# Altium footprint library Metric_SMD.PcbLib: 185 footprints (part 10 of 12)
Each footprint in its own frame and in the unit in brackets; x right, y up, seen from the top. Pads: shape width x height; smd on the part's side, far side on the other; paste and mask are expansions set on the pad; w line width, h text height; cw(c..) or ccw(c..) is an arc to the next point about the centre after c.
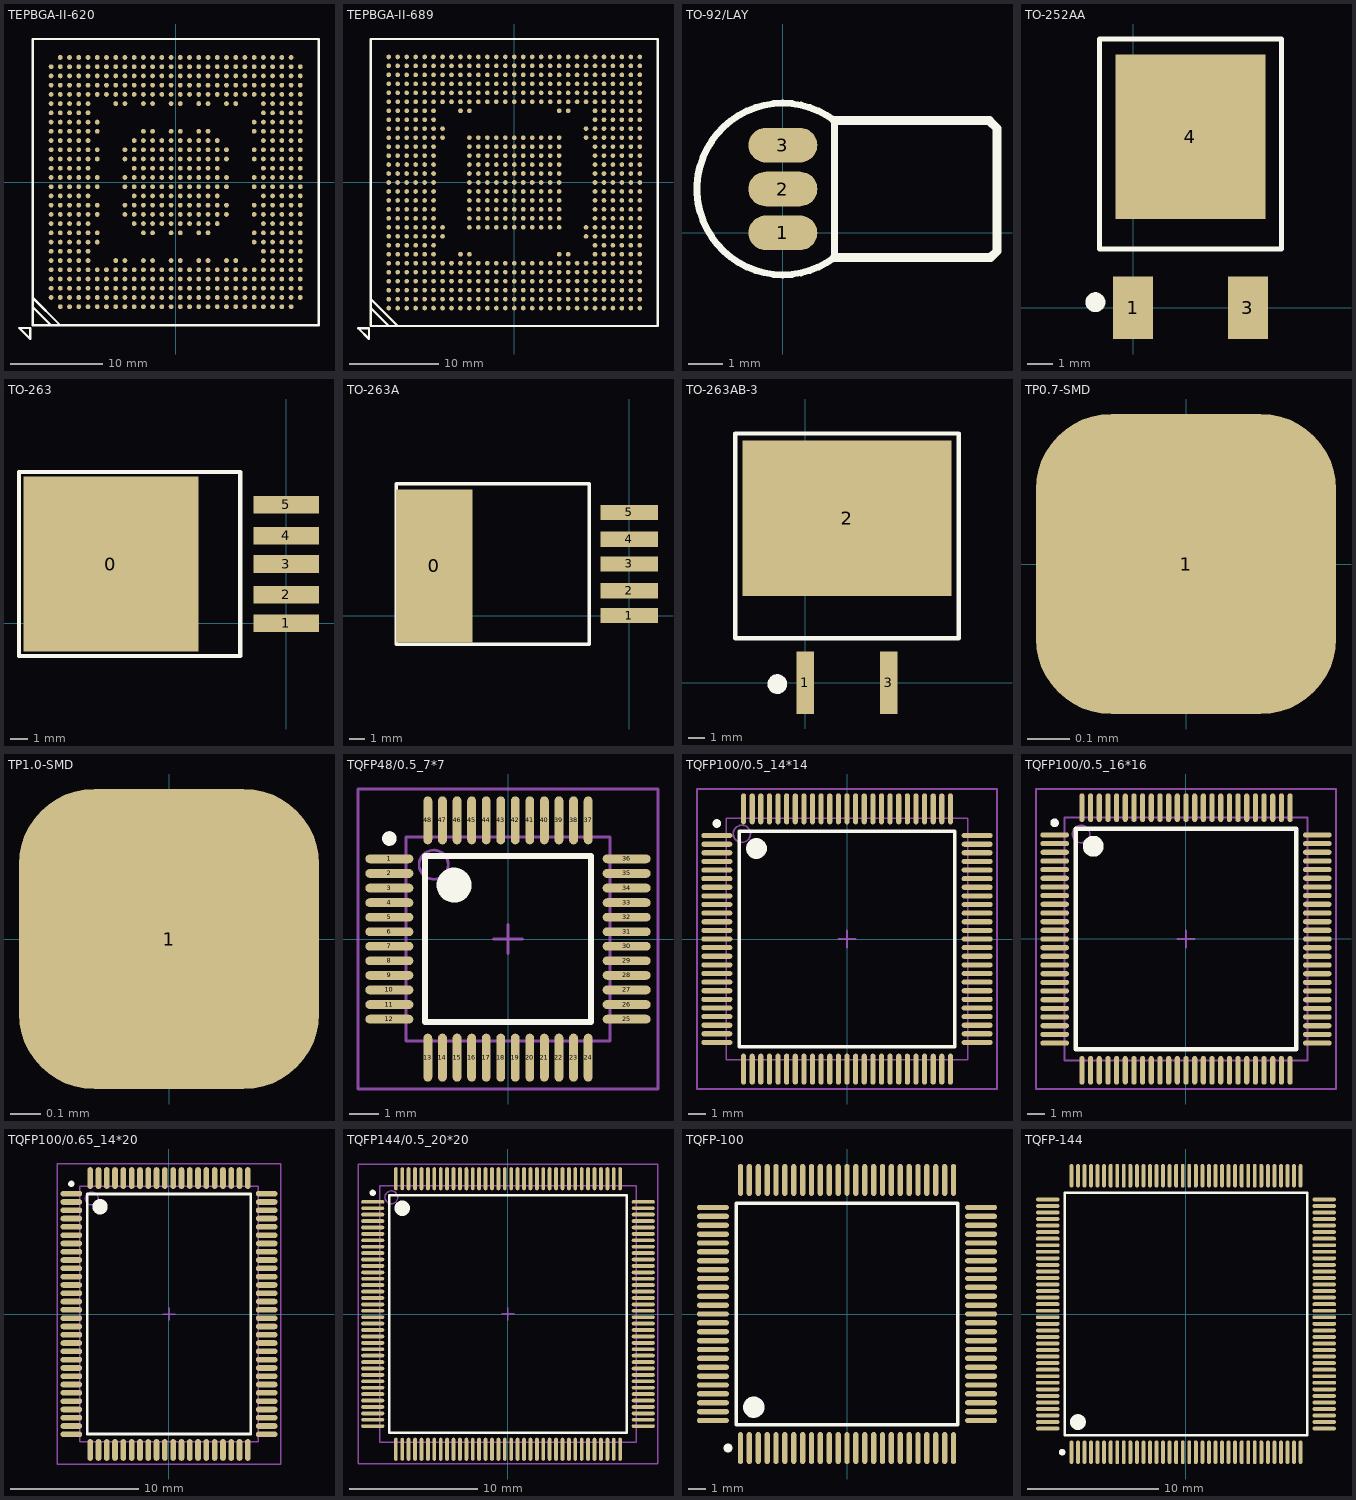
[diagram p9: the footprints below, top view; thin cyan lines are the x and y axes]

## TEPBGA-II-620 [mm] "1mm间距"
height 1
pads (620):
  round 0.52 smd: A2(-13.5,-12.5) A3(-13.5,-11.5) A4(-13.5,-10.5) A5(-13.5,-9.5) A6(-13.5,-8.5) A7(-13.5,-7.5) A8(-13.5,-6.5) A9(-13.5,-5.5) A10(-13.5,-4.5) A11(-13.5,-3.5) A12(-13.5,-2.5) A13(-13.5,-1.5) A14(-13.5,-0.5) A15(-13.5,0.5) A16(-13.5,1.5) A17(-13.5,2.5) A18(-13.5,3.5) A19(-13.5,4.5) A20(-13.5,5.5) A21(-13.5,6.5) A22(-13.5,7.5) A23(-13.5,8.5) A24(-13.5,9.5) A25(-13.5,10.5) A26(-13.5,11.5) A27(-13.5,12.5) AA1(6.5,-13.5) AA2(6.5,-12.5) AA3(6.5,-11.5) AA4(6.5,-10.5) AA5(6.5,-9.5) AA6(6.5,-8.5) AA23(6.5,8.5) AA24(6.5,9.5) AA25(6.5,10.5) AA26(6.5,11.5) AA27(6.5,12.5) AA28(6.5,13.5) AB1(7.5,-13.5) AB2(7.5,-12.5) AB3(7.5,-11.5) AB4(7.5,-10.5) AB5(7.5,-9.5) AB24(7.5,9.5) AB25(7.5,10.5) AB26(7.5,11.5) AB27(7.5,12.5) AB28(7.5,13.5) AC1(8.5,-13.5) AC2(8.5,-12.5) AC3(8.5,-11.5) AC4(8.5,-10.5) AC5(8.5,-9.5) AC8(8.5,-6.5) AC9(8.5,-5.5) AC11(8.5,-3.5) AC12(8.5,-2.5) AC14(8.5,-0.5) AC15(8.5,0.5) AC17(8.5,2.5) AC18(8.5,3.5) AC20(8.5,5.5) AC21(8.5,6.5) AC24(8.5,9.5) AC25(8.5,10.5) AC26(8.5,11.5) AC27(8.5,12.5) AC28(8.5,13.5) AD1(9.5,-13.5) AD2(9.5,-12.5) AD3(9.5,-11.5) AD4(9.5,-10.5) AD5(9.5,-9.5) AD6(9.5,-8.5) AD7(9.5,-7.5) AD8(9.5,-6.5) AD9(9.5,-5.5) AD10(9.5,-4.5) AD11(9.5,-3.5) AD12(9.5,-2.5) AD13(9.5,-1.5) AD14(9.5,-0.5) AD15(9.5,0.5) AD16(9.5,1.5) AD17(9.5,2.5) AD18(9.5,3.5) AD19(9.5,4.5) AD20(9.5,5.5) AD21(9.5,6.5) AD22(9.5,7.5) AD23(9.5,8.5) AD24(9.5,9.5) AD25(9.5,10.5) AD26(9.5,11.5) AD27(9.5,12.5) AD28(9.5,13.5) AE1(10.5,-13.5) AE2(10.5,-12.5) AE3(10.5,-11.5) AE4(10.5,-10.5) AE5(10.5,-9.5) AE6(10.5,-8.5) AE7(10.5,-7.5) AE8(10.5,-6.5) AE9(10.5,-5.5) AE10(10.5,-4.5) AE11(10.5,-3.5) AE12(10.5,-2.5) AE13(10.5,-1.5) AE14(10.5,-0.5) AE15(10.5,0.5) AE16(10.5,1.5) AE17(10.5,2.5) AE18(10.5,3.5) AE19(10.5,4.5) AE20(10.5,5.5) AE21(10.5,6.5) AE22(10.5,7.5) AE23(10.5,8.5) AE24(10.5,9.5) AE25(10.5,10.5) AE26(10.5,11.5) AE27(10.5,12.5) AE28(10.5,13.5) AF1(11.5,-13.5) AF2(11.5,-12.5) AF3(11.5,-11.5) AF4(11.5,-10.5) AF5(11.5,-9.5) AF6(11.5,-8.5) AF7(11.5,-7.5) AF8(11.5,-6.5) AF9(11.5,-5.5) AF10(11.5,-4.5) AF11(11.5,-3.5) AF12(11.5,-2.5) AF13(11.5,-1.5) AF14(11.5,-0.5) AF15(11.5,0.5) AF16(11.5,1.5) AF17(11.5,2.5) AF18(11.5,3.5) AF19(11.5,4.5) AF20(11.5,5.5) AF21(11.5,6.5) AF22(11.5,7.5) AF23(11.5,8.5) AF24(11.5,9.5) AF25(11.5,10.5) AF26(11.5,11.5) AF27(11.5,12.5) AF28(11.5,13.5) AG1(12.5,-13.5) AG2(12.5,-12.5) AG3(12.5,-11.5) AG4(12.5,-10.5) AG5(12.5,-9.5) AG6(12.5,-8.5) AG7(12.5,-7.5) AG8(12.5,-6.5) AG9(12.5,-5.5) AG10(12.5,-4.5) AG11(12.5,-3.5) AG12(12.5,-2.5) AG13(12.5,-1.5) AG14(12.5,-0.5) AG15(12.5,0.5) AG16(12.5,1.5) AG17(12.5,2.5) AG18(12.5,3.5) AG19(12.5,4.5) AG20(12.5,5.5) AG21(12.5,6.5) AG22(12.5,7.5) AG23(12.5,8.5) AG24(12.5,9.5) AG25(12.5,10.5) AG26(12.5,11.5) AG27(12.5,12.5) AG28(12.5,13.5) AH2(13.5,-12.5) AH3(13.5,-11.5) AH4(13.5,-10.5) AH5(13.5,-9.5) AH6(13.5,-8.5) AH7(13.5,-7.5) AH8(13.5,-6.5) AH9(13.5,-5.5) AH10(13.5,-4.5) AH11(13.5,-3.5) AH12(13.5,-2.5) AH13(13.5,-1.5) AH14(13.5,-0.5) AH15(13.5,0.5) AH16(13.5,1.5) AH17(13.5,2.5) AH18(13.5,3.5) AH19(13.5,4.5) AH20(13.5,5.5) AH21(13.5,6.5) AH22(13.5,7.5) AH23(13.5,8.5) AH24(13.5,9.5) AH25(13.5,10.5) AH26(13.5,11.5) AH27(13.5,12.5) B1(-12.5,-13.5) B2(-12.5,-12.5) B3(-12.5,-11.5) B4(-12.5,-10.5) B5(-12.5,-9.5) B6(-12.5,-8.5) B7(-12.5,-7.5) B8(-12.5,-6.5) B9(-12.5,-5.5) B10(-12.5,-4.5) B11(-12.5,-3.5) B12(-12.5,-2.5) B13(-12.5,-1.5) B14(-12.5,-0.5) B15(-12.5,0.5) B16(-12.5,1.5) B17(-12.5,2.5) B18(-12.5,3.5) B19(-12.5,4.5) B20(-12.5,5.5) B21(-12.5,6.5) B22(-12.5,7.5) B23(-12.5,8.5) B24(-12.5,9.5) B25(-12.5,10.5) B26(-12.5,11.5) B27(-12.5,12.5) B28(-12.5,13.5) C1(-11.5,-13.5) C2(-11.5,-12.5) C3(-11.5,-11.5) C4(-11.5,-10.5) C5(-11.5,-9.5) C6(-11.5,-8.5) C7(-11.5,-7.5) C8(-11.5,-6.5) C9(-11.5,-5.5) C10(-11.5,-4.5) C11(-11.5,-3.5) C12(-11.5,-2.5) C13(-11.5,-1.5) C14(-11.5,-0.5) C15(-11.5,0.5) C16(-11.5,1.5) C17(-11.5,2.5) C18(-11.5,3.5) C19(-11.5,4.5) C20(-11.5,5.5) C21(-11.5,6.5) C22(-11.5,7.5) C23(-11.5,8.5) C24(-11.5,9.5) C25(-11.5,10.5) C26(-11.5,11.5) C27(-11.5,12.5) C28(-11.5,13.5) D1(-10.5,-13.5) D2(-10.5,-12.5) D3(-10.5,-11.5) D4(-10.5,-10.5) D5(-10.5,-9.5) D6(-10.5,-8.5) D7(-10.5,-7.5) D8(-10.5,-6.5) D9(-10.5,-5.5) D10(-10.5,-4.5) D11(-10.5,-3.5) D12(-10.5,-2.5) D13(-10.5,-1.5) D14(-10.5,-0.5) D15(-10.5,0.5) D16(-10.5,1.5) D17(-10.5,2.5) D18(-10.5,3.5) D19(-10.5,4.5) D20(-10.5,5.5) D21(-10.5,6.5) D22(-10.5,7.5) D23(-10.5,8.5) D24(-10.5,9.5) D25(-10.5,10.5) D26(-10.5,11.5) D27(-10.5,12.5) D28(-10.5,13.5) E1(-9.5,-13.5) E2(-9.5,-12.5) E3(-9.5,-11.5) E4(-9.5,-10.5) E5(-9.5,-9.5) E6(-9.5,-8.5) E7(-9.5,-7.5) E8(-9.5,-6.5) E9(-9.5,-5.5) E10(-9.5,-4.5) E11(-9.5,-3.5) E12(-9.5,-2.5) E13(-9.5,-1.5) E14(-9.5,-0.5) E15(-9.5,0.5) E16(-9.5,1.5) E17(-9.5,2.5) E18(-9.5,3.5) E19(-9.5,4.5) E20(-9.5,5.5) E21(-9.5,6.5) E22(-9.5,7.5) E23(-9.5,8.5) E24(-9.5,9.5) E25(-9.5,10.5) E26(-9.5,11.5) E27(-9.5,12.5) E28(-9.5,13.5) F1(-8.5,-13.5) F2(-8.5,-12.5) F3(-8.5,-11.5) F4(-8.5,-10.5) F5(-8.5,-9.5) F8(-8.5,-6.5) F9(-8.5,-5.5) F11(-8.5,-3.5) F12(-8.5,-2.5) F14(-8.5,-0.5) F15(-8.5,0.5) F17(-8.5,2.5) F18(-8.5,3.5) F20(-8.5,5.5) F21(-8.5,6.5) F24(-8.5,9.5) F25(-8.5,10.5) F26(-8.5,11.5) F27(-8.5,12.5) F28(-8.5,13.5) G1(-7.5,-13.5) G2(-7.5,-12.5) G3(-7.5,-11.5) G4(-7.5,-10.5) G5(-7.5,-9.5) G24(-7.5,9.5) G25(-7.5,10.5) G26(-7.5,11.5) G27(-7.5,12.5) G28(-7.5,13.5) H1(-6.5,-13.5) H2(-6.5,-12.5) H3(-6.5,-11.5) H4(-6.5,-10.5) H5(-6.5,-9.5) H6(-6.5,-8.5) H23(-6.5,8.5) H24(-6.5,9.5) H25(-6.5,10.5) H26(-6.5,11.5) H27(-6.5,12.5) H28(-6.5,13.5) J1(-5.5,-13.5) J2(-5.5,-12.5) J3(-5.5,-11.5) J4(-5.5,-10.5) J5(-5.5,-9.5) J6(-5.5,-8.5) J11(-5.5,-3.5) J12(-5.5,-2.5) J14(-5.5,-0.5) J15(-5.5,0.5) J17(-5.5,2.5) J18(-5.5,3.5) J23(-5.5,8.5) J24(-5.5,9.5) J25(-5.5,10.5) J26(-5.5,11.5) J27(-5.5,12.5) J28(-5.5,13.5) K1(-4.5,-13.5) K2(-4.5,-12.5) K3(-4.5,-11.5) K4(-4.5,-10.5) K5(-4.5,-9.5) K10(-4.5,-4.5) K11(-4.5,-3.5) K12(-4.5,-2.5) K13(-4.5,-1.5) K14(-4.5,-0.5) K15(-4.5,0.5) K16(-4.5,1.5) K17(-4.5,2.5) K18(-4.5,3.5) K19(-4.5,4.5) K24(-4.5,9.5) K25(-4.5,10.5) K26(-4.5,11.5) K27(-4.5,12.5) K28(-4.5,13.5) L1(-3.5,-13.5) L2(-3.5,-12.5) L3(-3.5,-11.5) L4(-3.5,-10.5) L5(-3.5,-9.5) L6(-3.5,-8.5) L9(-3.5,-5.5) L10(-3.5,-4.5) L11(-3.5,-3.5) L12(-3.5,-2.5) L13(-3.5,-1.5) L14(-3.5,-0.5) L15(-3.5,0.5) L16(-3.5,1.5) L17(-3.5,2.5) L18(-3.5,3.5) L19(-3.5,4.5) L20(-3.5,5.5) L23(-3.5,8.5) L24(-3.5,9.5) L25(-3.5,10.5) L26(-3.5,11.5) L27(-3.5,12.5) L28(-3.5,13.5) M1(-2.5,-13.5) M2(-2.5,-12.5) M3(-2.5,-11.5) M4(-2.5,-10.5) M5(-2.5,-9.5) M6(-2.5,-8.5) M9(-2.5,-5.5) M10(-2.5,-4.5) M11(-2.5,-3.5) M12(-2.5,-2.5) M13(-2.5,-1.5) M14(-2.5,-0.5) M15(-2.5,0.5) M16(-2.5,1.5) M17(-2.5,2.5) M18(-2.5,3.5) M19(-2.5,4.5) M20(-2.5,5.5) M23(-2.5,8.5) M24(-2.5,9.5) M25(-2.5,10.5) M26(-2.5,11.5) M27(-2.5,12.5) M28(-2.5,13.5) N1(-1.5,-13.5) N2(-1.5,-12.5) N3(-1.5,-11.5) N4(-1.5,-10.5) N5(-1.5,-9.5) N10(-1.5,-4.5) N11(-1.5,-3.5) N12(-1.5,-2.5) N13(-1.5,-1.5) N14(-1.5,-0.5) N15(-1.5,0.5) N16(-1.5,1.5) N17(-1.5,2.5) N18(-1.5,3.5) N19(-1.5,4.5) N24(-1.5,9.5) N25(-1.5,10.5) N26(-1.5,11.5) N27(-1.5,12.5) N28(-1.5,13.5) P1(-0.5,-13.5) P2(-0.5,-12.5) P3(-0.5,-11.5) P4(-0.5,-10.5) P5(-0.5,-9.5) P6(-0.5,-8.5) P9(-0.5,-5.5) P10(-0.5,-4.5) P11(-0.5,-3.5) P12(-0.5,-2.5) P13(-0.5,-1.5) P14(-0.5,-0.5) P15(-0.5,0.5) P16(-0.5,1.5) P17(-0.5,2.5) P18(-0.5,3.5) P19(-0.5,4.5) P20(-0.5,5.5) P23(-0.5,8.5) P24(-0.5,9.5) P25(-0.5,10.5) P26(-0.5,11.5) P27(-0.5,12.5) P28(-0.5,13.5) R1(0.5,-13.5) R2(0.5,-12.5) R3(0.5,-11.5) R4(0.5,-10.5) R5(0.5,-9.5) R6(0.5,-8.5) R9(0.5,-5.5) R10(0.5,-4.5) R11(0.5,-3.5) R12(0.5,-2.5) R13(0.5,-1.5) R14(0.5,-0.5) R15(0.5,0.5) R16(0.5,1.5) R17(0.5,2.5) R18(0.5,3.5) R19(0.5,4.5) R20(0.5,5.5) R23(0.5,8.5) R24(0.5,9.5) R25(0.5,10.5) R26(0.5,11.5) R27(0.5,12.5) R28(0.5,13.5) T1(1.5,-13.5) T2(1.5,-12.5) T3(1.5,-11.5) T4(1.5,-10.5) T5(1.5,-9.5) T10(1.5,-4.5) T11(1.5,-3.5) T12(1.5,-2.5) T13(1.5,-1.5) T14(1.5,-0.5) T15(1.5,0.5) T16(1.5,1.5) T17(1.5,2.5) T18(1.5,3.5) T19(1.5,4.5) T24(1.5,9.5) T25(1.5,10.5) T26(1.5,11.5) T27(1.5,12.5) T28(1.5,13.5) U1(2.5,-13.5) U2(2.5,-12.5) U3(2.5,-11.5) U4(2.5,-10.5) U5(2.5,-9.5) U6(2.5,-8.5) U9(2.5,-5.5) U10(2.5,-4.5) U11(2.5,-3.5) U12(2.5,-2.5) U13(2.5,-1.5) U14(2.5,-0.5) U15(2.5,0.5) U16(2.5,1.5) U17(2.5,2.5) U18(2.5,3.5) U19(2.5,4.5) U20(2.5,5.5) U23(2.5,8.5) U24(2.5,9.5) U25(2.5,10.5) U26(2.5,11.5) U27(2.5,12.5) U28(2.5,13.5) V1(3.5,-13.5) V2(3.5,-12.5) V3(3.5,-11.5) V4(3.5,-10.5) V5(3.5,-9.5) V6(3.5,-8.5) V9(3.5,-5.5) V10(3.5,-4.5) V11(3.5,-3.5) V12(3.5,-2.5) V13(3.5,-1.5) V14(3.5,-0.5) V15(3.5,0.5) V16(3.5,1.5) V17(3.5,2.5) V18(3.5,3.5) V19(3.5,4.5) V20(3.5,5.5) V23(3.5,8.5) V24(3.5,9.5) V25(3.5,10.5) V26(3.5,11.5) V27(3.5,12.5) V28(3.5,13.5) W1(4.5,-13.5) W2(4.5,-12.5) W3(4.5,-11.5) W4(4.5,-10.5) W5(4.5,-9.5) W10(4.5,-4.5) W11(4.5,-3.5) W12(4.5,-2.5) W13(4.5,-1.5) W14(4.5,-0.5) W15(4.5,0.5) W16(4.5,1.5) W17(4.5,2.5) W18(4.5,3.5) W19(4.5,4.5) W24(4.5,9.5) W25(4.5,10.5) W26(4.5,11.5) W27(4.5,12.5) W28(4.5,13.5) Y1(5.5,-13.5) Y2(5.5,-12.5) Y3(5.5,-11.5) Y4(5.5,-10.5) Y5(5.5,-9.5) Y6(5.5,-8.5) Y11(5.5,-3.5) Y12(5.5,-2.5) Y14(5.5,-0.5) Y15(5.5,0.5) Y17(5.5,2.5) Y18(5.5,3.5) Y23(5.5,8.5) Y24(5.5,9.5) Y25(5.5,10.5) Y26(5.5,11.5) Y27(5.5,12.5) Y28(5.5,13.5)
Top Overlay:
  lines w0.254: -15.5,-13.5 -13.5,-15.5 ; -15.5,-12.5 -12.5,-15.5 ; -16.95,-15.8 -15.75,-17 -15.75,-15.8 -16.95,-15.8 ; -15.5,-15.5 15.5,-15.5 15.5,15.5 -15.5,15.5 -15.5,-15.5
3D body: height 1.3, standoff 0.7, extent -12.5,-12.5 12.5,12.5
3D body: height 1, standoff 0.1, extent -15.5,-15.5 15.5,15.5

## TEPBGA-II-689 [mm] "1mm间距"
height 1
pads (689):
  round 0.52 smd: A1(-14,-14) A2(-14,-13) A3(-14,-12) A4(-14,-11) A5(-14,-10) A6(-14,-9) A7(-14,-8) A8(-14,-7) A9(-14,-6) A10(-14,-5) A11(-14,-4) A12(-14,-3) A13(-14,-2) A14(-14,-1) A15(-14,0) A16(-14,1) A17(-14,2) A18(-14,3) A19(-14,4) A20(-14,5) A21(-14,6) A22(-14,7) A23(-14,8) A24(-14,9) A25(-14,10) A26(-14,11) A27(-14,12) A28(-14,13) A29(-14,14) AA1(6,-14) AA2(6,-13) AA3(6,-12) AA4(6,-11) AA5(6,-10) AA6(6,-9) AA7(6,-8) AA23(6,8) AA24(6,9) AA25(6,10) AA26(6,11) AA27(6,12) AA28(6,13) AA29(6,14) AB1(7,-14) AB2(7,-13) AB3(7,-12) AB4(7,-11) AB5(7,-10) AB6(7,-9) AB24(7,9) AB25(7,10) AB26(7,11) AB27(7,12) AB28(7,13) AB29(7,14) AC1(8,-14) AC2(8,-13) AC3(8,-12) AC4(8,-11) AC5(8,-10) AC6(8,-9) AC9(8,-6) AC10(8,-5) AC20(8,5) AC21(8,6) AC24(8,9) AC25(8,10) AC26(8,11) AC27(8,12) AC28(8,13) AC29(8,14) AD1(9,-14) AD2(9,-13) AD3(9,-12) AD4(9,-11) AD5(9,-10) AD6(9,-9) AD7(9,-8) AD8(9,-7) AD9(9,-6) AD10(9,-5) AD11(9,-4) AD12(9,-3) AD13(9,-2) AD14(9,-1) AD15(9,0) AD16(9,1) AD17(9,2) AD18(9,3) AD19(9,4) AD20(9,5) AD21(9,6) AD22(9,7) AD23(9,8) AD24(9,9) AD25(9,10) AD26(9,11) AD27(9,12) AD28(9,13) AD29(9,14) AE1(10,-14) AE2(10,-13) AE3(10,-12) AE4(10,-11) AE5(10,-10) AE6(10,-9) AE7(10,-8) AE8(10,-7) AE9(10,-6) AE10(10,-5) AE11(10,-4) AE12(10,-3) AE13(10,-2) AE14(10,-1) AE15(10,0) AE16(10,1) AE17(10,2) AE18(10,3) AE19(10,4) AE20(10,5) AE21(10,6) AE22(10,7) AE23(10,8) AE24(10,9) AE25(10,10) AE26(10,11) AE27(10,12) AE28(10,13) AE29(10,14) AF1(11,-14) AF2(11,-13) AF3(11,-12) AF4(11,-11) AF5(11,-10) AF6(11,-9) AF7(11,-8) AF8(11,-7) AF9(11,-6) AF10(11,-5) AF11(11,-4) AF12(11,-3) AF13(11,-2) AF14(11,-1) AF15(11,0) AF16(11,1) AF17(11,2) AF18(11,3) AF19(11,4) AF20(11,5) AF21(11,6) AF22(11,7) AF23(11,8) AF24(11,9) AF25(11,10) AF26(11,11) AF27(11,12) AF28(11,13) AF29(11,14) AG1(12,-14) AG2(12,-13) AG3(12,-12) AG4(12,-11) AG5(12,-10) AG6(12,-9) AG7(12,-8) AG8(12,-7) AG9(12,-6) AG10(12,-5) AG11(12,-4) AG12(12,-3) AG13(12,-2) AG14(12,-1) AG15(12,0) AG16(12,1) AG17(12,2) AG18(12,3) AG19(12,4) AG20(12,5) AG21(12,6) AG22(12,7) AG23(12,8) AG24(12,9) AG25(12,10) AG26(12,11) AG27(12,12) AG28(12,13) AG29(12,14) AH1(13,-14) AH2(13,-13) AH3(13,-12) AH4(13,-11) AH5(13,-10) AH6(13,-9) AH7(13,-8) AH8(13,-7) AH9(13,-6) AH10(13,-5) AH11(13,-4) AH12(13,-3) AH13(13,-2) AH14(13,-1) AH15(13,0) AH16(13,1) AH17(13,2) AH18(13,3) AH19(13,4) AH20(13,5) AH21(13,6) AH22(13,7) AH23(13,8) AH24(13,9) AH25(13,10) AH26(13,11) AH27(13,12) AH28(13,13) AH29(13,14) AJ1(14,-14) AJ2(14,-13) AJ3(14,-12) AJ4(14,-11) AJ5(14,-10) AJ6(14,-9) AJ7(14,-8) AJ8(14,-7) AJ9(14,-6) AJ10(14,-5) AJ11(14,-4) AJ12(14,-3) AJ13(14,-2) AJ14(14,-1) AJ15(14,0) AJ16(14,1) AJ17(14,2) AJ18(14,3) AJ19(14,4) AJ20(14,5) AJ21(14,6) AJ22(14,7) AJ23(14,8) AJ24(14,9) AJ25(14,10) AJ26(14,11) AJ27(14,12) AJ28(14,13) AJ29(14,14) B1(-13,-14) B2(-13,-13) B3(-13,-12) B4(-13,-11) B5(-13,-10) B6(-13,-9) B7(-13,-8) B8(-13,-7) B9(-13,-6) B10(-13,-5) B11(-13,-4) B12(-13,-3) B13(-13,-2) B14(-13,-1) B15(-13,0) B16(-13,1) B17(-13,2) B18(-13,3) B19(-13,4) B20(-13,5) B21(-13,6) B22(-13,7) B23(-13,8) B24(-13,9) B25(-13,10) B26(-13,11) B27(-13,12) B28(-13,13) B29(-13,14) C1(-12,-14) C2(-12,-13) C3(-12,-12) C4(-12,-11) C5(-12,-10) C6(-12,-9) C7(-12,-8) C8(-12,-7) C9(-12,-6) C10(-12,-5) C11(-12,-4) C12(-12,-3) C13(-12,-2) C14(-12,-1) C15(-12,0) C16(-12,1) C17(-12,2) C18(-12,3) C19(-12,4) C20(-12,5) C21(-12,6) C22(-12,7) C23(-12,8) C24(-12,9) C25(-12,10) C26(-12,11) C27(-12,12) C28(-12,13) C29(-12,14) D1(-11,-14) D2(-11,-13) D3(-11,-12) D4(-11,-11) D5(-11,-10) D6(-11,-9) D7(-11,-8) D8(-11,-7) D9(-11,-6) D10(-11,-5) D11(-11,-4) D12(-11,-3) D13(-11,-2) D14(-11,-1) D15(-11,0) D16(-11,1) D17(-11,2) D18(-11,3) D19(-11,4) D20(-11,5) D21(-11,6) D22(-11,7) D23(-11,8) D24(-11,9) D25(-11,10) D26(-11,11) D27(-11,12) D28(-11,13) D29(-11,14) E1(-10,-14) E2(-10,-13) E3(-10,-12) E4(-10,-11) E5(-10,-10) E6(-10,-9) E7(-10,-8) E8(-10,-7) E9(-10,-6) E10(-10,-5) E11(-10,-4) E12(-10,-3) E13(-10,-2) E14(-10,-1) E15(-10,0) E16(-10,1) E17(-10,2) E18(-10,3) E19(-10,4) E20(-10,5) E21(-10,6) E22(-10,7) E23(-10,8) E24(-10,9) E25(-10,10) E26(-10,11) E27(-10,12) E28(-10,13) E29(-10,14) F1(-9,-14) F2(-9,-13) F3(-9,-12) F4(-9,-11) F5(-9,-10) F6(-9,-9) F7(-9,-8) F8(-9,-7) F9(-9,-6) F10(-9,-5) F11(-9,-4) F12(-9,-3) F13(-9,-2) F14(-9,-1) F15(-9,0) F16(-9,1) F17(-9,2) F18(-9,3) F19(-9,4) F20(-9,5) F21(-9,6) F22(-9,7) F23(-9,8) F24(-9,9) F25(-9,10) F26(-9,11) F27(-9,12) F28(-9,13) F29(-9,14) G1(-8,-14) G2(-8,-13) G3(-8,-12) G4(-8,-11) G5(-8,-10) G6(-8,-9) G9(-8,-6) G10(-8,-5) G20(-8,5) G21(-8,6) G24(-8,9) G25(-8,10) G26(-8,11) G27(-8,12) G28(-8,13) G29(-8,14) H1(-7,-14) H2(-7,-13) H3(-7,-12) H4(-7,-11) H5(-7,-10) H6(-7,-9) H24(-7,9) H25(-7,10) H26(-7,11) H27(-7,12) H28(-7,13) H29(-7,14) J1(-6,-14) J2(-6,-13) J3(-6,-12) J4(-6,-11) J5(-6,-10) J6(-6,-9) J7(-6,-8) J23(-6,8) J24(-6,9) J25(-6,10) J26(-6,11) J27(-6,12) J28(-6,13) J29(-6,14) K1(-5,-14) K2(-5,-13) K3(-5,-12) K4(-5,-11) K5(-5,-10) K6(-5,-9) K7(-5,-8) K10(-5,-5) K11(-5,-4) K12(-5,-3) K13(-5,-2) K14(-5,-1) K15(-5,0) K16(-5,1) K17(-5,2) K18(-5,3) K19(-5,4) K20(-5,5) K23(-5,8) K24(-5,9) K25(-5,10) K26(-5,11) K27(-5,12) K28(-5,13) K29(-5,14) L1(-4,-14) L2(-4,-13) L3(-4,-12) L4(-4,-11) L5(-4,-10) L6(-4,-9) L10(-4,-5) L11(-4,-4) L12(-4,-3) L13(-4,-2) L14(-4,-1) L15(-4,0) L16(-4,1) L17(-4,2) L18(-4,3) L19(-4,4) L20(-4,5) L24(-4,9) L25(-4,10) L26(-4,11) L27(-4,12) L28(-4,13) L29(-4,14) M1(-3,-14) M2(-3,-13) M3(-3,-12) M4(-3,-11) M5(-3,-10) M6(-3,-9) M10(-3,-5) M11(-3,-4) M12(-3,-3) M13(-3,-2) M14(-3,-1) M15(-3,0) M16(-3,1) M17(-3,2) M18(-3,3) M19(-3,4) M20(-3,5) M24(-3,9) M25(-3,10) M26(-3,11) M27(-3,12) M28(-3,13) M29(-3,14) N1(-2,-14) N2(-2,-13) N3(-2,-12) N4(-2,-11) N5(-2,-10) N6(-2,-9) N10(-2,-5) N11(-2,-4) N12(-2,-3) N13(-2,-2) N14(-2,-1) N15(-2,0) N16(-2,1) N17(-2,2) N18(-2,3) N19(-2,4) N20(-2,5) N24(-2,9) N25(-2,10) N26(-2,11) N27(-2,12) N28(-2,13) N29(-2,14) P1(-1,-14) P2(-1,-13) P3(-1,-12) P4(-1,-11) P5(-1,-10) P6(-1,-9) P10(-1,-5) P11(-1,-4) P12(-1,-3) P13(-1,-2) P14(-1,-1) P15(-1,0) P16(-1,1) P17(-1,2) P18(-1,3) P19(-1,4) P20(-1,5) P24(-1,9) P25(-1,10) P26(-1,11) P27(-1,12) P28(-1,13) P29(-1,14) R1(0,-14) R2(0,-13) R3(0,-12) R4(0,-11) R5(0,-10) R6(0,-9) R10(0,-5) R11(0,-4) R12(0,-3) R13(0,-2) R14(0,-1) R15(0,0) R16(0,1) R17(0,2) R18(0,3) R19(0,4) R20(0,5) R24(0,9) R25(0,10) R26(0,11) R27(0,12) R28(0,13) R29(0,14) T1(1,-14) T2(1,-13) T3(1,-12) T4(1,-11) T5(1,-10) T6(1,-9) T10(1,-5) T11(1,-4) T12(1,-3) T13(1,-2) T14(1,-1) T15(1,0) T16(1,1) T17(1,2) T18(1,3) T19(1,4) T20(1,5) T24(1,9) T25(1,10) T26(1,11) T27(1,12) T28(1,13) T29(1,14) U1(2,-14) U2(2,-13) U3(2,-12) U4(2,-11) U5(2,-10) U6(2,-9) U10(2,-5) U11(2,-4) U12(2,-3) U13(2,-2) U14(2,-1) U15(2,0) U16(2,1) U17(2,2) U18(2,3) U19(2,4) U20(2,5) U24(2,9) U25(2,10) U26(2,11) U27(2,12) U28(2,13) U29(2,14) V1(3,-14) V2(3,-13) V3(3,-12) V4(3,-11) V5(3,-10) V6(3,-9) V10(3,-5) V11(3,-4) V12(3,-3) V13(3,-2) V14(3,-1) V15(3,0) V16(3,1) V17(3,2) V18(3,3) V19(3,4) V20(3,5) V24(3,9) V25(3,10) V26(3,11) V27(3,12) V28(3,13) V29(3,14) W1(4,-14) W2(4,-13) W3(4,-12) W4(4,-11) W5(4,-10) W6(4,-9) W10(4,-5) W11(4,-4) W12(4,-3) W13(4,-2) W14(4,-1) W15(4,0) W16(4,1) W17(4,2) W18(4,3) W19(4,4) W20(4,5) W24(4,9) W25(4,10) W26(4,11) W27(4,12) W28(4,13) W29(4,14) Y1(5,-14) Y2(5,-13) Y3(5,-12) Y4(5,-11) Y5(5,-10) Y6(5,-9) Y7(5,-8) Y10(5,-5) Y11(5,-4) Y12(5,-3) Y13(5,-2) Y14(5,-1) Y15(5,0) Y16(5,1) Y17(5,2) Y18(5,3) Y19(5,4) Y20(5,5) Y23(5,8) Y24(5,9) Y25(5,10) Y26(5,11) Y27(5,12) Y28(5,13) Y29(5,14)
Top Overlay:
  lines w0.254: -16,-14 -14,-16 ; -16,-13 -13,-16 ; -17.4,-16.25 -16.2,-16.25 -16.2,-17.45 -17.4,-16.25 ; -16,-16 -16,16 16,16 16,-16 -16,-16
3D body: height 2, standoff 1, extent -12,-12.1 12.169,12
3D body: height 1, standoff 0.1, extent -16.1,-16 16,16.023

## TO-92/LAY [mm] "卧式TO-92"
height 5
pads (3):
  oval 2x1 smd: 1(0,0) 2(0,1.27) 3(0,2.54)
Top Overlay:
  lines w0.2: 1.5,-0.71 cw(c0,1.27) 1.5,3.25 1.5,-0.71
  lines w0.254: 1.5,-0.71 6.02,-0.71 6.2,-0.53 6.2,3.03 5.98,3.25 1.5,3.25

## TO-252AA [mm]
height 2.4
pads (3):
  rect 1.6x2.5 smd: 1(0,0) 3(4.6,0)
  rect 6x6.6 smd: 4(2.3,6.85)
Top Overlay:
  circle w0.4: c-1.51,0.223 r0.2
  lines w0.2: -1.35,2.356 5.95,2.356 5.95,10.764 -1.35,10.764 -1.35,2.356
3D body "User Library-TO252AA.STEP": height 2.3, standoff -0.01, extent -0.965,-0.457 5.615,9.243

## TO-263 [mil] "TO263表贴5脚,TO220卧式"
height 118.11
pads (6):
  rect 400x400 smd: 0(-399.83,134.92)
  rect 150x40 smd: 1(0.17,-0.08) 2(0.17,64.92) 3(0.17,134.92) 4(0.17,199.92) 5(0.17,269.92)
Top Overlay:
  lines w10: -609.83,-75.08 -104.83,-75.08 -104.83,344.92 -609.83,344.92 -609.83,-75.08
3D body: height 94.49, standoff 0, extent -456.69,-74.8 -106.69,333.86
3D body: height 50, standoff 35, extent -102.05,263.46 -23.62,283.46
3D body: height 50, standoff 0, extent -36.61,263.46 -16.61,283.46
3D body: height 50, standoff 0, extent -36.61,188.66 -16.61,208.66
3D body: height 50, standoff 35, extent -102.05,188.66 -23.62,208.66
3D body: height 50, standoff 0, extent -36.61,54.8 -16.61,74.8
3D body: height 50, standoff 35, extent -102.05,54.8 -23.62,74.8
3D body: height 50, standoff 0, extent -36.61,-12.13 -16.61,7.87
3D body: height 50, standoff 35, extent -102.05,-12.13 -23.62,7.87
3D body: height 50, standoff 0, extent -36.61,125.67 -16.61,145.67
3D body: height 50, standoff 35, extent -102.05,125.67 -23.62,145.67
3D body: height 50, standoff 0, extent -559.06,-78.74 -457.56,334.65

## TO-263A [mil] "TO263表贴5脚,TO220卧式"
height 118.11
pads (6):
  rect 200x400 smd: 0(-510,130)
  rect 150x40 smd: 1(0.17,-0.08) 2(0.17,64.92) 3(0.17,134.92) 4(0.17,199.92) 5(0.17,269.92)
Top Overlay:
  lines w10: -609.83,-75.08 -609.83,344.92 -104.83,344.92 -104.83,-75.08 -609.83,-75.08
3D body: height 94.49, standoff 0, extent -452.76,-74.8 -102.76,333.86
3D body: height 50, standoff 35, extent -98.11,263.46 -19.68,283.46
3D body: height 50, standoff 0, extent -32.68,263.46 -12.68,283.46
3D body: height 50, standoff 0, extent -32.68,188.66 -12.68,208.66
3D body: height 50, standoff 35, extent -98.11,188.66 -19.68,208.66
3D body: height 50, standoff 0, extent -32.68,54.8 -12.68,74.8
3D body: height 50, standoff 35, extent -98.11,54.8 -19.68,74.8
3D body: height 50, standoff 0, extent -32.68,-12.13 -12.68,7.87
3D body: height 50, standoff 35, extent -98.11,-12.13 -19.68,7.87
3D body: height 50, standoff 0, extent -32.68,125.67 -12.68,145.67
3D body: height 50, standoff 35, extent -98.11,125.67 -19.68,145.67
3D body: height 50, standoff 0, extent -555.12,-78.74 -453.62,334.65

## TO-263AB-3 [mm] "FDB3632"
height 4.83
pads (3):
  rect 1.05x3.8 smd: 1(0,0) 3(5.08,0)
  rect 12.7x9.45 smd: 2(2.54,10)
Top Overlay:
  circle w0.6: c-1.697,-0.08 r0.3
  lines w0.254: -4.26,2.705 9.34,2.705 9.34,15.155 -4.26,15.155 -4.26,2.705

## TP0.7-SMD [mm] "0.7mm测试点"
pads (1):
  rrect50% 0.7x0.7 smd: 1(0,0)

## TP1.0-SMD [mm] "1.0mm测试点"
pads (1):
  rrect50% 1x1 smd: 1(0,0)

## TQFP48/0.5_7*7 [mm] "TQFP, 48-Leads, Body 9.0x9.0mm (max), Pitch 0.50mm, IPC Medium Density"
height 1.2
pads (48):
  oval 1.65x0.3 smd: 1(-4.075,2.75) 2(-4.075,2.25) 3(-4.075,1.75) 4(-4.075,1.25) 5(-4.075,0.75) 6(-4.075,0.25) 7(-4.075,-0.25) 8(-4.075,-0.75) 9(-4.075,-1.25) 10(-4.075,-1.75) 11(-4.075,-2.25) 12(-4.075,-2.75) 25(4.075,-2.75) 26(4.075,-2.25) 27(4.075,-1.75) 28(4.075,-1.25) 29(4.075,-0.75) 30(4.075,-0.25) 31(4.075,0.25) 32(4.075,0.75) 33(4.075,1.25) 34(4.075,1.75) 35(4.075,2.25) 36(4.075,2.75)
  oval 0.3x1.65 smd: 13(-2.75,-4.075) 14(-2.25,-4.075) 15(-1.75,-4.075) 16(-1.25,-4.075) 17(-0.75,-4.075) 18(-0.25,-4.075) 19(0.25,-4.075) 20(0.75,-4.075) 21(1.25,-4.075) 22(1.75,-4.075) 23(2.25,-4.075) 24(2.75,-4.075) 37(2.75,4.075) 38(2.25,4.075) 39(1.75,4.075) 40(1.25,4.075) 41(0.75,4.075) 42(0.25,4.075) 43(-0.25,4.075) 44(-0.75,4.075) 45(-1.25,4.075) 46(-1.75,4.075) 47(-2.25,4.075) 48(-2.75,4.075)
Top Overlay:
  circle w0.6: c-1.85,1.85 r0.3
  circle w0.25: c-4.075,3.45 r0.125
  lines w0.2: -2.85,-2.85 2.85,-2.85 2.85,2.85 -2.85,2.85 -2.85,-2.85
Mechanical 13:
  circle w0.1: c-2.55,2.55 r0.5
  lines w0.1: -3.5,-3.5 3.5,-3.5 3.5,3.5 -3.5,3.5 -3.5,-3.5
Mechanical 15:
  lines w0.1: -0.5,0 0.5,0 ; 0,-0.5 0,0.5 ; -5.15,-5.15 5.15,-5.15 5.15,5.15 -5.15,5.15 -5.15,-5.15
3D body: height 1.2, standoff 0.05, extent -3.5,-3.5 3.5,3.5

## TQFP100/0.5_14*14 [mm] "Thin QFP, 100-Leads, Body 14x14mm, Pitch 0.5mm, IPC Medium Density"
height 1.6
pads (100):
  oval 1.8x0.3 smd: 1(-7.55,6) 2(-7.55,5.5) 3(-7.55,5) 4(-7.55,4.5) 5(-7.55,4) 6(-7.55,3.5) 7(-7.55,3) 8(-7.55,2.5) 9(-7.55,2) 10(-7.55,1.5) 11(-7.55,1) 12(-7.55,0.5) 13(-7.55,0) 14(-7.55,-0.5) 15(-7.55,-1) 16(-7.55,-1.5) 17(-7.55,-2) 18(-7.55,-2.5) 19(-7.55,-3) 20(-7.55,-3.5) 21(-7.55,-4) 22(-7.55,-4.5) 23(-7.55,-5) 24(-7.55,-5.5) 25(-7.55,-6) 51(7.55,-6) 52(7.55,-5.5) 53(7.55,-5) 54(7.55,-4.5) 55(7.55,-4) 56(7.55,-3.5) 57(7.55,-3) 58(7.55,-2.5) 59(7.55,-2) 60(7.55,-1.5) 61(7.55,-1) 62(7.55,-0.5) 63(7.55,0) 64(7.55,0.5) 65(7.55,1) 66(7.55,1.5) 67(7.55,2) 68(7.55,2.5) 69(7.55,3) 70(7.55,3.5) 71(7.55,4) 72(7.55,4.5) 73(7.55,5) 74(7.55,5.5) 75(7.55,6)
  oval 0.3x1.8 smd: 26(-6,-7.55) 27(-5.5,-7.55) 28(-5,-7.55) 29(-4.5,-7.55) 30(-4,-7.55) 31(-3.5,-7.55) 32(-3,-7.55) 33(-2.5,-7.55) 34(-2,-7.55) 35(-1.5,-7.55) 36(-1,-7.55) 37(-0.5,-7.55) 38(0,-7.55) 39(0.5,-7.55) 40(1,-7.55) 41(1.5,-7.55) 42(2,-7.55) 43(2.5,-7.55) 44(3,-7.55) 45(3.5,-7.55) 46(4,-7.55) 47(4.5,-7.55) 48(5,-7.55) 49(5.5,-7.55) 50(6,-7.55) 76(6,7.55) 77(5.5,7.55) 78(5,7.55) 79(4.5,7.55) 80(4,7.55) 81(3.5,7.55) 82(3,7.55) 83(2.5,7.55) 84(2,7.55) 85(1.5,7.55) 86(1,7.55) 87(0.5,7.55) 88(0,7.55) 89(-0.5,7.55) 90(-1,7.55) 91(-1.5,7.55) 92(-2,7.55) 93(-2.5,7.55) 94(-3,7.55) 95(-3.5,7.55) 96(-4,7.55) 97(-4.5,7.55) 98(-5,7.55) 99(-5.5,7.55) 100(-6,7.55)
Top Overlay:
  circle w0.6: c-5.25,5.25 r0.3
  circle w0.25: c-7.55,6.7 r0.125
  lines w0.2: -6.25,-6.25 6.25,-6.25 6.25,6.25 -6.25,6.25 -6.25,-6.25
Mechanical 13:
  circle w0.1: c-6.1,6.1 r0.5
  lines w0.1: -7,-7 7,-7 7,7 -7,7 -7,-7
Mechanical 15:
  lines w0.1: -0.5,0 0.5,0 ; 0,-0.5 0,0.5 ; -8.7,-8.7 8.7,-8.7 8.7,8.7 -8.7,8.7 -8.7,-8.7
3D body "TQFP50P1600X1600X120-100N MS-026AED VQ100.STEP": height 1.35, standoff 0, extent -8.014,-8.028 8.014,8

## TQFP100/0.5_16*16 [mm] "TSQFP, 100-Leads, Body 16.0x16.0mm (max), Pitch 0.50mm, IPC Medium Density"
height 1.2
pads (100):
  oval 1.65x0.3 smd: 1(-7.575,6) 2(-7.575,5.5) 3(-7.575,5) 4(-7.575,4.5) 5(-7.575,4) 6(-7.575,3.5) 7(-7.575,3) 8(-7.575,2.5) 9(-7.575,2) 10(-7.575,1.5) 11(-7.575,1) 12(-7.575,0.5) 13(-7.575,0) 14(-7.575,-0.5) 15(-7.575,-1) 16(-7.575,-1.5) 17(-7.575,-2) 18(-7.575,-2.5) 19(-7.575,-3) 20(-7.575,-3.5) 21(-7.575,-4) 22(-7.575,-4.5) 23(-7.575,-5) 24(-7.575,-5.5) 25(-7.575,-6) 51(7.575,-6) 52(7.575,-5.5) 53(7.575,-5) 54(7.575,-4.5) 55(7.575,-4) 56(7.575,-3.5) 57(7.575,-3) 58(7.575,-2.5) 59(7.575,-2) 60(7.575,-1.5) 61(7.575,-1) 62(7.575,-0.5) 63(7.575,0) 64(7.575,0.5) 65(7.575,1) 66(7.575,1.5) 67(7.575,2) 68(7.575,2.5) 69(7.575,3) 70(7.575,3.5) 71(7.575,4) 72(7.575,4.5) 73(7.575,5) 74(7.575,5.5) 75(7.575,6)
  oval 0.3x1.65 smd: 26(-6,-7.575) 27(-5.5,-7.575) 28(-5,-7.575) 29(-4.5,-7.575) 30(-4,-7.575) 31(-3.5,-7.575) 32(-3,-7.575) 33(-2.5,-7.575) 34(-2,-7.575) 35(-1.5,-7.575) 36(-1,-7.575) 37(-0.5,-7.575) 38(0,-7.575) 39(0.5,-7.575) 40(1,-7.575) 41(1.5,-7.575) 42(2,-7.575) 43(2.5,-7.575) 44(3,-7.575) 45(3.5,-7.575) 46(4,-7.575) 47(4.5,-7.575) 48(5,-7.575) 49(5.5,-7.575) 50(6,-7.575) 76(6,7.575) 77(5.5,7.575) 78(5,7.575) 79(4.5,7.575) 80(4,7.575) 81(3.5,7.575) 82(3,7.575) 83(2.5,7.575) 84(2,7.575) 85(1.5,7.575) 86(1,7.575) 87(0.5,7.575) 88(0,7.575) 89(-0.5,7.575) 90(-1,7.575) 91(-1.5,7.575) 92(-2,7.575) 93(-2.5,7.575) 94(-3,7.575) 95(-3.5,7.575) 96(-4,7.575) 97(-4.5,7.575) 98(-5,7.575) 99(-5.5,7.575) 100(-6,7.575)
Top Overlay:
  circle w0.25: c-7.575,6.7 r0.125
  circle w0.6: c-5.35,5.35 r0.3
  lines w0.25: -6.35,-6.35 -6.35,6.35 6.35,6.35 6.35,-6.35 -6.35,-6.35
Mechanical 13:
  circle w0.1: c-6.05,6.05 r0.5
  lines w0.1: -7,-7 -7,7 7,7 7,-7 -7,-7
Mechanical 15:
  lines w0.1: -0.5,0 0.5,0 ; 0,-0.5 0,0.5 ; -8.65,-8.65 -8.65,8.65 8.65,8.65 8.65,-8.65 -8.65,-8.65
3D body "TQFP50P1600X1600X120-100N MS-026AED VQ100.STEP": height 1.35, standoff 0, extent -8.014,-8.028 8.014,8

## TQFP100/0.65_14*20 [mm] "TQFP, 100-Leads, Body 22.2x16.2mm (max), Pitch 0.65mm, IPC Medium Density"
height 1.6
pads (100):
  oval 1.7x0.45 smd: 1(-7.65,9.425) 2(-7.65,8.775) 3(-7.65,8.125) 4(-7.65,7.475) 5(-7.65,6.825) 6(-7.65,6.175) 7(-7.65,5.525) 8(-7.65,4.875) 9(-7.65,4.225) 10(-7.65,3.575) 11(-7.65,2.925) 12(-7.65,2.275) 13(-7.65,1.625) 14(-7.65,0.975) 15(-7.65,0.325) 16(-7.65,-0.325) 17(-7.65,-0.975) 18(-7.65,-1.625) 19(-7.65,-2.275) 20(-7.65,-2.925) 21(-7.65,-3.575) 22(-7.65,-4.225) 23(-7.65,-4.875) 24(-7.65,-5.525) 25(-7.65,-6.175) 26(-7.65,-6.825) 27(-7.65,-7.475) 28(-7.65,-8.125) 29(-7.65,-8.775) 30(-7.65,-9.425) 51(7.65,-9.425) 52(7.65,-8.775) 53(7.65,-8.125) 54(7.65,-7.475) 55(7.65,-6.825) 56(7.65,-6.175) 57(7.65,-5.525) 58(7.65,-4.875) 59(7.65,-4.225) 60(7.65,-3.575) 61(7.65,-2.925) 62(7.65,-2.275) 63(7.65,-1.625) 64(7.65,-0.975) 65(7.65,-0.325) 66(7.65,0.325) 67(7.65,0.975) 68(7.65,1.625) 69(7.65,2.275) 70(7.65,2.925) 71(7.65,3.575) 72(7.65,4.225) 73(7.65,4.875) 74(7.65,5.525) 75(7.65,6.175) 76(7.65,6.825) 77(7.65,7.475) 78(7.65,8.125) 79(7.65,8.775) 80(7.65,9.425)
  oval 0.45x1.7 smd: 31(-6.175,-10.65) 32(-5.525,-10.65) 33(-4.875,-10.65) 34(-4.225,-10.65) 35(-3.575,-10.65) 36(-2.925,-10.65) 37(-2.275,-10.65) 38(-1.625,-10.65) 39(-0.975,-10.65) 40(-0.325,-10.65) 41(0.325,-10.65) 42(0.975,-10.65) 43(1.625,-10.65) 44(2.275,-10.65) 45(2.925,-10.65) 46(3.575,-10.65) 47(4.225,-10.65) 48(4.875,-10.65) 49(5.525,-10.65) 50(6.175,-10.65) 81(6.175,10.65) 82(5.525,10.65) 83(4.875,10.65) 84(4.225,10.65) 85(3.575,10.65) 86(2.925,10.65) 87(2.275,10.65) 88(1.625,10.65) 89(0.975,10.65) 90(0.325,10.65) 91(-0.325,10.65) 92(-0.975,10.65) 93(-1.625,10.65) 94(-2.275,10.65) 95(-2.925,10.65) 96(-3.575,10.65) 97(-4.225,10.65) 98(-4.875,10.65) 99(-5.525,10.65) 100(-6.175,10.65)
Top Overlay:
  circle w0.6: c-5.4,8.4 r0.3
  circle w0.25: c-7.65,10.2 r0.125
  lines w0.2: -6.4,-9.4 6.4,-9.4 6.4,9.4 -6.4,9.4 -6.4,-9.4
Mechanical 13:
  circle w0.1: c-6.05,9.05 r0.5
  lines w0.1: -7,-10 7,-10 7,10 -7,10 -7,-10
Mechanical 15:
  lines w0.1: -0.5,0 0.5,0 ; 0,-0.5 0,0.5 ; -8.75,-11.75 8.75,-11.75 8.75,11.75 -8.75,11.75 -8.75,-11.75
3D body: height 1.6, standoff 0.05, extent -7,-10 7,10

## TQFP144/0.5_20*20 [mm] "Thin QFP, 144-Leads, Body 20x20mm, Pitch 0.5mm, IPC Medium Density"
height 1.6
pads (144):
  oval 1.8x0.3 smd: 1(-10.55,8.75) 2(-10.55,8.25) 3(-10.55,7.75) 4(-10.55,7.25) 5(-10.55,6.75) 6(-10.55,6.25) 7(-10.55,5.75) 8(-10.55,5.25) 9(-10.55,4.75) 10(-10.55,4.25) 11(-10.55,3.75) 12(-10.55,3.25) 13(-10.55,2.75) 14(-10.55,2.25) 15(-10.55,1.75) 16(-10.55,1.25) 17(-10.55,0.75) 18(-10.55,0.25) 19(-10.55,-0.25) 20(-10.55,-0.75) 21(-10.55,-1.25) 22(-10.55,-1.75) 23(-10.55,-2.25) 24(-10.55,-2.75) 25(-10.55,-3.25) 26(-10.55,-3.75) 27(-10.55,-4.25) 28(-10.55,-4.75) 29(-10.55,-5.25) 30(-10.55,-5.75) 31(-10.55,-6.25) 32(-10.55,-6.75) 33(-10.55,-7.25) 34(-10.55,-7.75) 35(-10.55,-8.25) 36(-10.55,-8.75) 73(10.55,-8.75) 74(10.55,-8.25) 75(10.55,-7.75) 76(10.55,-7.25) 77(10.55,-6.75) 78(10.55,-6.25) 79(10.55,-5.75) 80(10.55,-5.25) 81(10.55,-4.75) 82(10.55,-4.25) 83(10.55,-3.75) 84(10.55,-3.25) 85(10.55,-2.75) 86(10.55,-2.25) 87(10.55,-1.75) 88(10.55,-1.25) 89(10.55,-0.75) 90(10.55,-0.25) 91(10.55,0.25) 92(10.55,0.75) 93(10.55,1.25) 94(10.55,1.75) 95(10.55,2.25) 96(10.55,2.75) 97(10.55,3.25) 98(10.55,3.75) 99(10.55,4.25) 100(10.55,4.75) 101(10.55,5.25) 102(10.55,5.75) 103(10.55,6.25) 104(10.55,6.75) 105(10.55,7.25) 106(10.55,7.75) 107(10.55,8.25) 108(10.55,8.75)
  oval 0.3x1.8 smd: 37(-8.75,-10.55) 38(-8.25,-10.55) 39(-7.75,-10.55) 40(-7.25,-10.55) 41(-6.75,-10.55) 42(-6.25,-10.55) 43(-5.75,-10.55) 44(-5.25,-10.55) 45(-4.75,-10.55) 46(-4.25,-10.55) 47(-3.75,-10.55) 48(-3.25,-10.55) 49(-2.75,-10.55) 50(-2.25,-10.55) 51(-1.75,-10.55) 52(-1.25,-10.55) 53(-0.75,-10.55) 54(-0.25,-10.55) 55(0.25,-10.55) 56(0.75,-10.55) 57(1.25,-10.55) 58(1.75,-10.55) 59(2.25,-10.55) 60(2.75,-10.55) 61(3.25,-10.55) 62(3.75,-10.55) 63(4.25,-10.55) 64(4.75,-10.55) 65(5.25,-10.55) 66(5.75,-10.55) 67(6.25,-10.55) 68(6.75,-10.55) 69(7.25,-10.55) 70(7.75,-10.55) 71(8.25,-10.55) 72(8.75,-10.55) 109(8.75,10.55) 110(8.25,10.55) 111(7.75,10.55) 112(7.25,10.55) 113(6.75,10.55) 114(6.25,10.55) 115(5.75,10.55) 116(5.25,10.55) 117(4.75,10.55) 118(4.25,10.55) 119(3.75,10.55) 120(3.25,10.55) 121(2.75,10.55) 122(2.25,10.55) 123(1.75,10.55) 124(1.25,10.55) 125(0.75,10.55) 126(0.25,10.55) 127(-0.25,10.55) 128(-0.75,10.55) 129(-1.25,10.55) 130(-1.75,10.55) 131(-2.25,10.55) 132(-2.75,10.55) 133(-3.25,10.55) 134(-3.75,10.55) 135(-4.25,10.55) 136(-4.75,10.55) 137(-5.25,10.55) 138(-5.75,10.55) 139(-6.25,10.55) 140(-6.75,10.55) 141(-7.25,10.55) 142(-7.75,10.55) 143(-8.25,10.55) 144(-8.75,10.55)
Top Overlay:
  circle w0.25: c-10.55,9.45 r0.125
  circle w0.6: c-8.25,8.25 r0.3
  lines w0.2: -9.25,-9.25 -9.25,9.25 9.25,9.25 9.25,-9.25 -9.25,-9.25
Mechanical 13:
  circle w0.1: c-9.1,9.1 r0.5
  lines w0.1: -10,-10 -10,10 10,10 10,-10 -10,-10
Mechanical 15:
  lines w0.1: -0.5,0 0.5,0 ; 0,-0.5 0,0.5 ; -11.7,-11.7 -11.7,11.7 11.7,11.7 11.7,-11.7 -11.7,-11.7
3D body: height 1.6, standoff 0, extent -10,-10 10,10

## TQFP-100 [mm] "Thin QFP, 100-Leads, Body 14x14mm, Pitch 0.5mm, IPC Medium Density"
height 1.2
pads (100):
  oval 0.3x1.8 smd: 1(-6,-7.55) 2(-5.5,-7.55) 3(-5,-7.55) 4(-4.5,-7.55) 5(-4,-7.55) 6(-3.5,-7.55) 7(-3,-7.55) 8(-2.5,-7.55) 9(-2,-7.55) 10(-1.5,-7.55) 11(-1,-7.55) 12(-0.5,-7.55) 13(0,-7.55) 14(0.5,-7.55) 15(1,-7.55) 16(1.5,-7.55) 17(2,-7.55) 18(2.5,-7.55) 19(3,-7.55) 20(3.5,-7.55) 21(4,-7.55) 22(4.5,-7.55) 23(5,-7.55) 24(5.5,-7.55) 25(6,-7.55) 51(6,7.55) 52(5.5,7.55) 53(5,7.55) 54(4.5,7.55) 55(4,7.55) 56(3.5,7.55) 57(3,7.55) 58(2.5,7.55) 59(2,7.55) 60(1.5,7.55) 61(1,7.55) 62(0.5,7.55) 63(0,7.55) 64(-0.5,7.55) 65(-1,7.55) 66(-1.5,7.55) 67(-2,7.55) 68(-2.5,7.55) 69(-3,7.55) 70(-3.5,7.55) 71(-4,7.55) 72(-4.5,7.55) 73(-5,7.55) 74(-5.5,7.55) 75(-6,7.55)
  oval 1.8x0.3 smd: 26(7.55,-6) 27(7.55,-5.5) 28(7.55,-5) 29(7.55,-4.5) 30(7.55,-4) 31(7.55,-3.5) 32(7.55,-3) 33(7.55,-2.5) 34(7.55,-2) 35(7.55,-1.5) 36(7.55,-1) 37(7.55,-0.5) 38(7.55,0) 39(7.55,0.5) 40(7.55,1) 41(7.55,1.5) 42(7.55,2) 43(7.55,2.5) 44(7.55,3) 45(7.55,3.5) 46(7.55,4) 47(7.55,4.5) 48(7.55,5) 49(7.55,5.5) 50(7.55,6) 76(-7.55,6) 77(-7.55,5.5) 78(-7.55,5) 79(-7.55,4.5) 80(-7.55,4) 81(-7.55,3.5) 82(-7.55,3) 83(-7.55,2.5) 84(-7.55,2) 85(-7.55,1.5) 86(-7.55,1) 87(-7.55,0.5) 88(-7.55,0) 89(-7.55,-0.5) 90(-7.55,-1) 91(-7.55,-1.5) 92(-7.55,-2) 93(-7.55,-2.5) 94(-7.55,-3) 95(-7.55,-3.5) 96(-7.55,-4) 97(-7.55,-4.5) 98(-7.55,-5) 99(-7.55,-5.5) 100(-7.55,-6)
Top Overlay:
  circle w0.25: c-6.7,-7.55 r0.125
  circle w0.6: c-5.25,-5.25 r0.3
  lines w0.2: -6.25,-6.25 6.25,-6.25 6.25,6.25 -6.25,6.25 -6.25,-6.25
3D body: height 1, standoff 0.6, extent -6.1,-7.65 -5.9,-6.2
3D body "TQFP50P1600X1600X120-100N MS-026AED VQ100.STEP": height 1.35, standoff 0, extent -8.039,-8.003 7.989,8.025

## TQFP-144 [mm] "Thin QFP, 144-Leads, Body 20x20mm, Pitch 0.5mm, IPC Medium Density"
height 1.6
pads (144):
  oval 0.3x1.8 smd: 1(-8.75,-10.55) 2(-8.25,-10.55) 3(-7.75,-10.55) 4(-7.25,-10.55) 5(-6.75,-10.55) 6(-6.25,-10.55) 7(-5.75,-10.55) 8(-5.25,-10.55) 9(-4.75,-10.55) 10(-4.25,-10.55) 11(-3.75,-10.55) 12(-3.25,-10.55) 13(-2.75,-10.55) 14(-2.25,-10.55) 15(-1.75,-10.55) 16(-1.25,-10.55) 17(-0.75,-10.55) 18(-0.25,-10.55) 19(0.25,-10.55) 20(0.75,-10.55) 21(1.25,-10.55) 22(1.75,-10.55) 23(2.25,-10.55) 24(2.75,-10.55) 25(3.25,-10.55) 26(3.75,-10.55) 27(4.25,-10.55) 28(4.75,-10.55) 29(5.25,-10.55) 30(5.75,-10.55) 31(6.25,-10.55) 32(6.75,-10.55) 33(7.25,-10.55) 34(7.75,-10.55) 35(8.25,-10.55) 36(8.75,-10.55) 73(8.75,10.55) 74(8.25,10.55) 75(7.75,10.55) 76(7.25,10.55) 77(6.75,10.55) 78(6.25,10.55) 79(5.75,10.55) 80(5.25,10.55) 81(4.75,10.55) 82(4.25,10.55) 83(3.75,10.55) 84(3.25,10.55) 85(2.75,10.55) 86(2.25,10.55) 87(1.75,10.55) 88(1.25,10.55) 89(0.75,10.55) 90(0.25,10.55) 91(-0.25,10.55) 92(-0.75,10.55) 93(-1.25,10.55) 94(-1.75,10.55) 95(-2.25,10.55) 96(-2.75,10.55) 97(-3.25,10.55) 98(-3.75,10.55) 99(-4.25,10.55) 100(-4.75,10.55) 101(-5.25,10.55) 102(-5.75,10.55) 103(-6.25,10.55) 104(-6.75,10.55) 105(-7.25,10.55) 106(-7.75,10.55) 107(-8.25,10.55) 108(-8.75,10.55)
  oval 1.8x0.3 smd: 37(10.55,-8.75) 38(10.55,-8.25) 39(10.55,-7.75) 40(10.55,-7.25) 41(10.55,-6.75) 42(10.55,-6.25) 43(10.55,-5.75) 44(10.55,-5.25) 45(10.55,-4.75) 46(10.55,-4.25) 47(10.55,-3.75) 48(10.55,-3.25) 49(10.55,-2.75) 50(10.55,-2.25) 51(10.55,-1.75) 52(10.55,-1.25) 53(10.55,-0.75) 54(10.55,-0.25) 55(10.55,0.25) 56(10.55,0.75) 57(10.55,1.25) 58(10.55,1.75) 59(10.55,2.25) 60(10.55,2.75) 61(10.55,3.25) 62(10.55,3.75) 63(10.55,4.25) 64(10.55,4.75) 65(10.55,5.25) 66(10.55,5.75) 67(10.55,6.25) 68(10.55,6.75) 69(10.55,7.25) 70(10.55,7.75) 71(10.55,8.25) 72(10.55,8.75) 109(-10.55,8.75) 110(-10.55,8.25) 111(-10.55,7.75) 112(-10.55,7.25) 113(-10.55,6.75) 114(-10.55,6.25) 115(-10.55,5.75) 116(-10.55,5.25) 117(-10.55,4.75) 118(-10.55,4.25) 119(-10.55,3.75) 120(-10.55,3.25) 121(-10.55,2.75) 122(-10.55,2.25) 123(-10.55,1.75) 124(-10.55,1.25) 125(-10.55,0.75) 126(-10.55,0.25) 127(-10.55,-0.25) 128(-10.55,-0.75) 129(-10.55,-1.25) 130(-10.55,-1.75) 131(-10.55,-2.25) 132(-10.55,-2.75) 133(-10.55,-3.25) 134(-10.55,-3.75) 135(-10.55,-4.25) 136(-10.55,-4.75) 137(-10.55,-5.25) 138(-10.55,-5.75) 139(-10.55,-6.25) 140(-10.55,-6.75) 141(-10.55,-7.25) 142(-10.55,-7.75) 143(-10.55,-8.25) 144(-10.55,-8.75)
Top Overlay:
  circle w0.25: c-9.45,-10.55 r0.125
  circle w0.6: c-8.25,-8.25 r0.3
  lines w0.2: -9.25,-9.25 9.25,-9.25 9.25,9.25 -9.25,9.25 -9.25,-9.25